# Altium footprint library Toi Library.PcbLib: 740 footprints (part 3 of 47)
Each footprint in its own frame and in the unit in brackets; x right, y up, seen from the top. Pads: shape width x height; smd on the part's side, far side on the other; paste and mask are expansions set on the pad; w line width, h text height; cw(c..) or ccw(c..) is an arc to the next point about the centre after c.
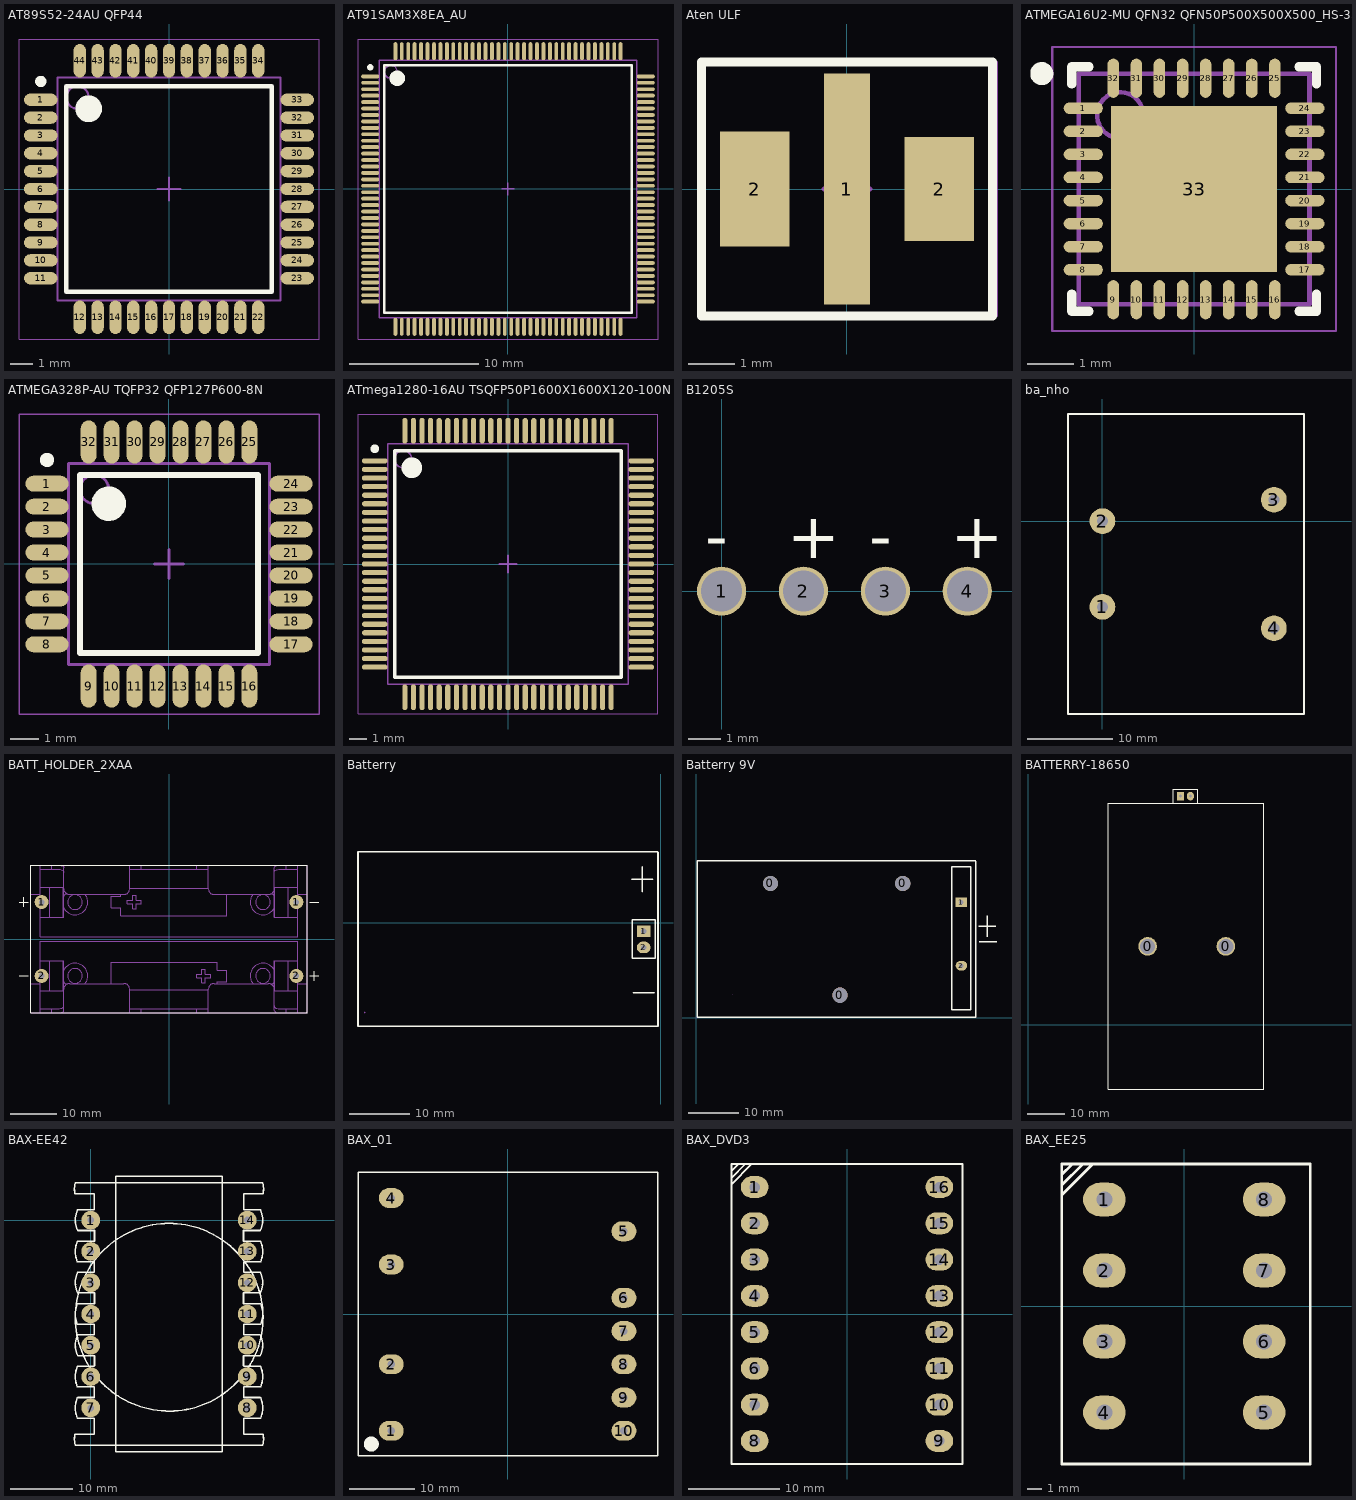
[diagram p2: the footprints below, top view; thin cyan lines are the x and y axes]

## AT89S52-24AU QFP44 [mm] "TQFP, 44-Leads, Body 10.00x10.00mm, Pitch 0.80mm, IPC Medium Density"
height 1.5
pads (44):
  oval 1.5x0.55 smd: 1(-5.75,4) 2(-5.75,3.2) 3(-5.75,2.4) 4(-5.75,1.6) 5(-5.75,0.8) 6(-5.75,0) 7(-5.75,-0.8) 8(-5.75,-1.6) 9(-5.75,-2.4) 10(-5.75,-3.2) 11(-5.75,-4) 23(5.75,-4) 24(5.75,-3.2) 25(5.75,-2.4) 26(5.75,-1.6) 27(5.75,-0.8) 28(5.75,0) 29(5.75,0.8) 30(5.75,1.6) 31(5.75,2.4) 32(5.75,3.2) 33(5.75,4)
  oval 0.55x1.5 smd: 12(-4,-5.75) 13(-3.2,-5.75) 14(-2.4,-5.75) 15(-1.6,-5.75) 16(-0.8,-5.75) 17(0,-5.75) 18(0.8,-5.75) 19(1.6,-5.75) 20(2.4,-5.75) 21(3.2,-5.75) 22(4,-5.75) 34(4,5.75) 35(3.2,5.75) 36(2.4,5.75) 37(1.6,5.75) 38(0.8,5.75) 39(0,5.75) 40(-0.8,5.75) 41(-1.6,5.75) 42(-2.4,5.75) 43(-3.2,5.75) 44(-4,5.75)
Top Overlay:
  circle w0.25: c-5.75,4.825 r0.125
  circle w0.6: c-3.6,3.6 r0.3
  lines w0.2: -4.6,-4.6 -4.6,4.6 4.6,4.6 4.6,-4.6 -4.6,-4.6
Mechanical 13:
  circle w0.1: c-4.1,4.1 r0.5
  lines w0.1: -5,-5 -5,5 5,5 5,-5 -5,-5
Mechanical 15:
  lines w0.05: -6.725,-6.725 -6.725,6.725 6.725,6.725 6.725,-6.725 -6.725,-6.725
  lines w0.1: -0.5,0 0.5,0 ; 0,-0.5 0,0.5
3D body "AT89S52-24AU QFP44.step": height 1.5, standoff 0, extent -6,-6 6,6

## AT91SAM3X8EA_AU [mm] "TSQFP, 144-Leads, Body 20.00x20.00mm, Pitch 0.50mm, IPC Medium Density"
height 1.45
pads (144):
  oval 1.4x0.3 smd: 1(-10.7,8.75) 2(-10.7,8.25) 3(-10.7,7.75) 4(-10.7,7.25) 5(-10.7,6.75) 6(-10.7,6.25) 7(-10.7,5.75) 8(-10.7,5.25) 9(-10.7,4.75) 10(-10.7,4.25) 11(-10.7,3.75) 12(-10.7,3.25) 13(-10.7,2.75) 14(-10.7,2.25) 15(-10.7,1.75) 16(-10.7,1.25) 17(-10.7,0.75) 18(-10.7,0.25) 19(-10.7,-0.25) 20(-10.7,-0.75) 21(-10.7,-1.25) 22(-10.7,-1.75) 23(-10.7,-2.25) 24(-10.7,-2.75) 25(-10.7,-3.25) 26(-10.7,-3.75) 27(-10.7,-4.25) 28(-10.7,-4.75) 29(-10.7,-5.25) 30(-10.7,-5.75) 31(-10.7,-6.25) 32(-10.7,-6.75) 33(-10.7,-7.25) 34(-10.7,-7.75) 35(-10.7,-8.25) 36(-10.7,-8.75) 73(10.7,-8.75) 74(10.7,-8.25) 75(10.7,-7.75) 76(10.7,-7.25) 77(10.7,-6.75) 78(10.7,-6.25) 79(10.7,-5.75) 80(10.7,-5.25) 81(10.7,-4.75) 82(10.7,-4.25) 83(10.7,-3.75) 84(10.7,-3.25) 85(10.7,-2.75) 86(10.7,-2.25) 87(10.7,-1.75) 88(10.7,-1.25) 89(10.7,-0.75) 90(10.7,-0.25) 91(10.7,0.25) 92(10.7,0.75) 93(10.7,1.25) 94(10.7,1.75) 95(10.7,2.25) 96(10.7,2.75) 97(10.7,3.25) 98(10.7,3.75) 99(10.7,4.25) 100(10.7,4.75) 101(10.7,5.25) 102(10.7,5.75) 103(10.7,6.25) 104(10.7,6.75) 105(10.7,7.25) 106(10.7,7.75) 107(10.7,8.25) 108(10.7,8.75)
  oval 0.3x1.4 smd: 37(-8.75,-10.7) 38(-8.25,-10.7) 39(-7.75,-10.7) 40(-7.25,-10.7) 41(-6.75,-10.7) 42(-6.25,-10.7) 43(-5.75,-10.7) 44(-5.25,-10.7) 45(-4.75,-10.7) 46(-4.25,-10.7) 47(-3.75,-10.7) 48(-3.25,-10.7) 49(-2.75,-10.7) 50(-2.25,-10.7) 51(-1.75,-10.7) 52(-1.25,-10.7) 53(-0.75,-10.7) 54(-0.25,-10.7) 55(0.25,-10.7) 56(0.75,-10.7) 57(1.25,-10.7) 58(1.75,-10.7) 59(2.25,-10.7) 60(2.75,-10.7) 61(3.25,-10.7) 62(3.75,-10.7) 63(4.25,-10.7) 64(4.75,-10.7) 65(5.25,-10.7) 66(5.75,-10.7) 67(6.25,-10.7) 68(6.75,-10.7) 69(7.25,-10.7) 70(7.75,-10.7) 71(8.25,-10.7) 72(8.75,-10.7) 109(8.75,10.7) 110(8.25,10.7) 111(7.75,10.7) 112(7.25,10.7) 113(6.75,10.7) 114(6.25,10.7) 115(5.75,10.7) 116(5.25,10.7) 117(4.75,10.7) 118(4.25,10.7) 119(3.75,10.7) 120(3.25,10.7) 121(2.75,10.7) 122(2.25,10.7) 123(1.75,10.7) 124(1.25,10.7) 125(0.75,10.7) 126(0.25,10.7) 127(-0.25,10.7) 128(-0.75,10.7) 129(-1.25,10.7) 130(-1.75,10.7) 131(-2.25,10.7) 132(-2.75,10.7) 133(-3.25,10.7) 134(-3.75,10.7) 135(-4.25,10.7) 136(-4.75,10.7) 137(-5.25,10.7) 138(-5.75,10.7) 139(-6.25,10.7) 140(-6.75,10.7) 141(-7.25,10.7) 142(-7.75,10.7) 143(-8.25,10.7) 144(-8.75,10.7)
Top Overlay:
  circle w0.6: c-8.6,8.6 r0.3
  circle w0.25: c-10.7,9.45 r0.125
  lines w0.2: -9.6,-9.6 9.6,-9.6 9.6,9.6 -9.6,9.6 -9.6,-9.6
Mechanical 13:
  circle w0.1: c-9.1,9.1 r0.5
  lines w0.1: -10,-10 10,-10 10,10 -10,10 -10,-10
Mechanical 15:
  lines w0.05: -11.65,-11.65 11.65,-11.65 11.65,11.65 -11.65,11.65 -11.65,-11.65
  lines w0.1: -0.5,0 0.5,0 ; 0,-0.5 0,0.5
3D body "AT91SAM3X8EA_AU.step": height 1.45, standoff 0, extent -10.9,-10.9 10.9,10.9

## Aten ULF [mm] "Molded Capacitor, 2-Leads, Body 6.00x3.20mm, IPC Medium Density"
height 2.5
pads (3):
  rect 1x5 smd: 1(0,0)
  rect 1.5x2.5 smd: 2(-2,0)
  rect 1.5x2.25 smd: 2(2,0)
Top Overlay:
  lines w0.2: -3.15,-2.75 -3.15,2.75 3.15,2.75 3.15,-2.75 -3.15,-2.75
Mechanical 13:
  lines w0.1: -3.15,-2.75 3.15,-2.75 3.15,2.75 -3.15,2.75 -3.15,-2.75
Mechanical 15:
  lines w0.05: -3.125,-2.75 3.25,-2.75 3.25,2.75 -3.125,2.75 -3.125,-2.75
  lines w0.1: -0.5,0 0.5,0 ; 0,-0.5 0,0.5
3D body "SW3dPS-UFL-R-SMD.STEP": height 1.25, standoff 0, extent -1.7,-1.55 1.7,1.55

## ATMEGA16U2-MU QFN32 QFN50P500X500X500_HS-33N [mm] "QFN, 32-Leads, Body 5.00x5.00mm, Pitch 0.50mm, Thermal Pad 3.60x3.60mm, IPC Medium Density"
height 1
pads (33):
  oval 0.85x0.25 smd: 1(-2.4,1.75) 2(-2.4,1.25) 3(-2.4,0.75) 4(-2.4,0.25) 5(-2.4,-0.25) 6(-2.4,-0.75) 7(-2.4,-1.25) 8(-2.4,-1.75) 17(2.4,-1.75) 18(2.4,-1.25) 19(2.4,-0.75) 20(2.4,-0.25) 21(2.4,0.25) 22(2.4,0.75) 23(2.4,1.25) 24(2.4,1.75)
  oval 0.25x0.85 smd: 9(-1.75,-2.4) 10(-1.25,-2.4) 11(-0.75,-2.4) 12(-0.25,-2.4) 13(0.25,-2.4) 14(0.75,-2.4) 15(1.25,-2.4) 16(1.75,-2.4) 25(1.75,2.4) 26(1.25,2.4) 27(0.75,2.4) 28(0.25,2.4) 29(-0.25,2.4) 30(-0.75,2.4) 31(-1.25,2.4) 32(-1.75,2.4)
  rect 3.6x3.6 smd: 33(0,0)
Top Overlay:
  circle w0.25: c-3.3,2.5 r0.125
  lines w0.2: -2.65,-2.275 -2.65,-2.65 -2.275,-2.65 ; -2.65,2.275 -2.65,2.65 -2.275,2.65 ; 2.275,-2.65 2.65,-2.65 2.65,-2.275 ; 2.275,2.65 2.65,2.65 2.65,2.275
Mechanical 13:
  circle w0.1: c-1.6,1.6 r0.5
  lines w0.1: -2.5,-2.5 2.5,-2.5 2.5,2.5 -2.5,2.5 -2.5,-2.5
Mechanical 15:
  lines w0.05: -3.075,-3.075 3.075,-3.075 3.075,3.075 -3.075,3.075 -3.075,-3.075
  lines w0.1: -0.5,0 0.5,0 ; 0,-0.5 0,0.5
3D body "ATMEGA16U2-MU QFN32 QFN50P500X500X500_HS-33N.step": height 1, standoff 0, extent -2.55,-2.55 2.55,2.55

## ATMEGA328P-AU TQFP32 QFP127P600-8N [mm]
height 1.2
pads (32):
  oval 1.5x0.55 smd: 1(-4.25,2.8) 2(-4.25,2) 3(-4.25,1.2) 4(-4.25,0.4) 5(-4.25,-0.4) 6(-4.25,-1.2) 7(-4.25,-2) 8(-4.25,-2.8) 17(4.25,-2.8) 18(4.25,-2) 19(4.25,-1.2) 20(4.25,-0.4) 21(4.25,0.4) 22(4.25,1.2) 23(4.25,2) 24(4.25,2.8)
  oval 0.55x1.5 smd: 9(-2.8,-4.25) 10(-2,-4.25) 11(-1.2,-4.25) 12(-0.4,-4.25) 13(0.4,-4.25) 14(1.2,-4.25) 15(2,-4.25) 16(2.8,-4.25) 25(2.8,4.25) 26(2,4.25) 27(1.2,4.25) 28(0.4,4.25) 29(-0.4,4.25) 30(-1.2,4.25) 31(-2,4.25) 32(-2.8,4.25)
Top Overlay:
  circle w0.6: c-2.1,2.1 r0.3
  circle w0.25: c-4.25,3.625 r0.125
  lines w0.2: -3.1,-3.1 3.1,-3.1 3.1,3.1 -3.1,3.1 -3.1,-3.1
Mechanical 13:
  circle w0.1: c-2.6,2.6 r0.5
  lines w0.1: -3.5,-3.5 3.5,-3.5 3.5,3.5 -3.5,3.5 -3.5,-3.5
Mechanical 15:
  lines w0.05: -5.225,-5.225 5.225,-5.225 5.225,5.225 -5.225,5.225 -5.225,-5.225
  lines w0.1: -0.5,0 0.5,0 ; 0,-0.5 0,0.5
3D body "ATMEGA328P-AU TQFP32 QFP127P600-8N.step": height 1.2, standoff 0, extent -4.5,-4.5 4.5,4.5

## ATmega1280-16AU TSQFP50P1600X1600X120-100N [mm] "TSQFP, 100-Leads, Body 14.00x14.00mm, Pitch 0.50mm, IPC Medium Density"
height 1.2
pads (100):
  oval 1.5x0.3 smd: 1(-7.75,6) 2(-7.75,5.5) 3(-7.75,5) 4(-7.75,4.5) 5(-7.75,4) 6(-7.75,3.5) 7(-7.75,3) 8(-7.75,2.5) 9(-7.75,2) 10(-7.75,1.5) 11(-7.75,1) 12(-7.75,0.5) 13(-7.75,0) 14(-7.75,-0.5) 15(-7.75,-1) 16(-7.75,-1.5) 17(-7.75,-2) 18(-7.75,-2.5) 19(-7.75,-3) 20(-7.75,-3.5) 21(-7.75,-4) 22(-7.75,-4.5) 23(-7.75,-5) 24(-7.75,-5.5) 25(-7.75,-6) 51(7.75,-6) 52(7.75,-5.5) 53(7.75,-5) 54(7.75,-4.5) 55(7.75,-4) 56(7.75,-3.5) 57(7.75,-3) 58(7.75,-2.5) 59(7.75,-2) 60(7.75,-1.5) 61(7.75,-1) 62(7.75,-0.5) 63(7.75,0) 64(7.75,0.5) 65(7.75,1) 66(7.75,1.5) 67(7.75,2) 68(7.75,2.5) 69(7.75,3) 70(7.75,3.5) 71(7.75,4) 72(7.75,4.5) 73(7.75,5) 74(7.75,5.5) 75(7.75,6)
  oval 0.3x1.5 smd: 26(-6,-7.75) 27(-5.5,-7.75) 28(-5,-7.75) 29(-4.5,-7.75) 30(-4,-7.75) 31(-3.5,-7.75) 32(-3,-7.75) 33(-2.5,-7.75) 34(-2,-7.75) 35(-1.5,-7.75) 36(-1,-7.75) 37(-0.5,-7.75) 38(0,-7.75) 39(0.5,-7.75) 40(1,-7.75) 41(1.5,-7.75) 42(2,-7.75) 43(2.5,-7.75) 44(3,-7.75) 45(3.5,-7.75) 46(4,-7.75) 47(4.5,-7.75) 48(5,-7.75) 49(5.5,-7.75) 50(6,-7.75) 76(6,7.75) 77(5.5,7.75) 78(5,7.75) 79(4.5,7.75) 80(4,7.75) 81(3.5,7.75) 82(3,7.75) 83(2.5,7.75) 84(2,7.75) 85(1.5,7.75) 86(1,7.75) 87(0.5,7.75) 88(0,7.75) 89(-0.5,7.75) 90(-1,7.75) 91(-1.5,7.75) 92(-2,7.75) 93(-2.5,7.75) 94(-3,7.75) 95(-3.5,7.75) 96(-4,7.75) 97(-4.5,7.75) 98(-5,7.75) 99(-5.5,7.75) 100(-6,7.75)
Top Overlay:
  circle w0.6: c-5.6,5.6 r0.3
  circle w0.25: c-7.75,6.7 r0.125
  lines w0.2: -6.6,-6.6 6.6,-6.6 6.6,6.6 -6.6,6.6 -6.6,-6.6
Mechanical 13:
  circle w0.1: c-6.1,6.1 r0.5
  lines w0.1: -7,-7 7,-7 7,7 -7,7 -7,-7
Mechanical 15:
  lines w0.05: -8.725,-8.725 8.725,-8.725 8.725,8.725 -8.725,8.725 -8.725,-8.725
  lines w0.1: -0.5,0 0.5,0 ; 0,-0.5 0,0.5
3D body "ATmega1280-16AU TSQFP50P1600X1600X120-100N.step": height 1.2, standoff 0, extent -8,-8 8,8

## B1205S [mil] "B1205S-1W Chuy?n Ð?i DC-DC Vào 12V Ra 5V 1W"
pads (4):
  round 60 hole 50: 1(0,0) 2(100,0) 3(200,0) 4(300,0)
Top Overlay:
  text "-" at -20,40 h56.25
  text "+" at 80,40 h56.25
  text "+" at 280,40 h56.25
  text "-" at 180,40 h56.25

## ba_nho [mm]
pads (4):
  round 3 hole 1.27: 1(0,-10) 2(0,0) 3(20,2.5) 4(20,-12.5)
Top Overlay:
  lines w0.254: -4,-22.5 -4,12.5 23.5,12.5 23.5,-22.5 -4,-22.5

## BATT_HOLDER_2XAA [mil] "2-cell AA battery holder"
height 660
pads (4):
  round 120 hole 48: 1(-1086.61,314.96) 1(1086.61,314.96) 2(-1086.61,-314.96) 2(1086.61,-314.96)
Top Overlay:
  lines w5: -1279.53,-314.96 -1200.79,-314.96 ; -1279.53,314.96 -1200.79,314.96 ; -1240.16,275.59 -1240.16,354.33 ; 1200.79,-314.96 1279.53,-314.96 ; 1200.79,314.96 1279.53,314.96 ; 1240.16,-354.33 1240.16,-275.59
  lines w7.87: -1181.1,-629.92 1181.1,-629.92 1181.1,629.92 -1181.1,629.92 -1181.1,-629.92
Mechanical 13:
  drawing of 198 lines, arcs and shapes, not listed
3D body "2xAA Battery Holder.STEP": height 657.48, standoff -118.11, extent -1181.1,-629.91 1181.1,629.93
3D body "User Library-Battery-AAA.STEP": height 595.47, standoff 191.93, extent -958.03,55 788.03,458.55
3D body "User Library-Battery-AAA.STEP": height 595.47, standoff 191.93, extent -918.03,-470 828.03,-66.45

## Batterry [mil]
pads (2):
  rect 90x75 hole 34: 1(-112.5,-54.6)
  oval 90x75 hole 34: 2(-112.5,-159.6)
Top Overlay:
  lines w10: -188.8,284 -54.5,284 ; -182.1,-455.9 -43.1,-455.9 ; -120.9,202.1 -120.9,365.8 ; -20,463.4 -1974.6,463.4 -1974.6,-672.4 -19.27,-672.4 -19.27,459.86 ; -187.5,-229.6 -37.5,-229.6 -37.5,20.4 -187.5,20.4 -187.5,-229.6
Mechanical 1:
  lines w10: -1929.25,-583.45 -1929.2,-583.41
3D body "User Library-Aluminum 9 Volt Battery Holder.STEP": height 718.5, standoff 0, extent -1960.3,-666.19 -27.8,458.8

## Batterry 9V [mil]
pads (5):
  round 120 hole 120: 0(581.4,1052.4) 0(1126.9,175.9) 0(1620.4,1052.5)
  rect 90x75 hole 34: 1(2080.5,905.75)
  oval 90x75 hole 34: 2(2080.5,407.05)
Top Overlay:
  lines w10: 2193,1230.1 4.6,1230.1 4.6,3.1 2193.73,3.1 2193.73,1226.56 ; 2216.7,717.5 2351,717.5 ; 2221,595 2360,595 ; 2284.6,635.6 2284.6,799.3 ; 2005.5,60 2005.5,1185 2155.5,1185 2155.5,60 2005.5,60
Mechanical 1:
  lines w10: 283.75,183.25 283.8,183.29
3D body "User Library-9V Duracell Battery-1.STEP": height 894.49, standoff 205.51, extent 140.78,88.65 2050.23,1131.96
3D body "User Library-PP3 9V battery holder.STEP": height 855.91, standoff 44.88, extent 27.27,19.55 2172.93,1210.5

## BATTERRY-18650 [mil]
pads (4):
  round 196.85 hole 157.48: 0(1260,825) 0(2085,825)
  rect 75x90 hole 34: 1(1606.1,2410.5)
  oval 75x90 hole 34: 2(1711.1,2410.5)
Top Overlay:
  lines w10: 845,-680 2485,-680 2485,2335 845,2335 845,-680 ; 1531.1,2335.5 1781.1,2335.5 1781.1,2485.5 1531.1,2485.5 1531.1,2335.5
3D body "User Library-18650 battery - Copy.STEP": height 959.53, standoff 242.99, extent 1698.47,-492.48 2415,2072.48
3D body "User Library-18650 holder x2.STEP": height 826.77, standoff 0, extent 860.82,-671.06 2475,2321.06
3D body "User Library-18650 battery.STEP": height 959.53, standoff 242.99, extent 905,-497.48 1621.53,2067.48

## BAX-EE42 [mm]
pads (14):
  round 3 hole 1.1: 1(0,0) 2(0,-5) 3(0,-10) 4(0,-15) 5(0,-20) 6(0,-25) 7(0,-30) 8(25,-30) 9(25,-25) 10(25,-20) 11(25,-15) 12(25,-10) 13(25,-5) 14(25,0)
Top Overlay:
  lines w0.254: -2.54,-34.199 ccw(c1.383,-34.971) -2.495,-35.943 ; -2.54,4.201 cw(c1.383,4.974) -2.495,5.945 ; -2.515,-34.188 0.559,-34.188 0.559,-31.648 -2.083,-31.648 ; -2.515,4.191 0.559,4.191 0.559,1.651 -2.083,1.651 ; -2.5,-36 27.5,-36 ; -2.5,6 27.5,6 ; -2.464,-14.986 ccw(c12.522,-15.519) -2.458,-14.838 ; -2.147,-28.374 ccw(c1.506,-30.001) -2.136,-31.652 ; -2.147,-23.371 ccw(c1.506,-24.997) -2.136,-26.648 ; -2.147,-13.363 ccw(c1.506,-14.989) -2.136,-16.64 ; -2.147,-3.381 ccw(c1.506,-5.007) -2.136,-6.658 ; -2.121,-18.367 ccw(c1.531,-19.993) -2.11,-21.644 ; -2.121,-8.359 ccw(c1.531,-9.985) -2.11,-11.636 ; -2.121,1.623 ccw(c1.531,-0.003) -2.11,-1.654 ; -2.108,-28.346 0.533,-28.346 ; -2.108,-23.343 0.533,-23.343 ; -2.108,-13.335 0.533,-13.335 ; -2.108,-3.353 0.533,-3.353 ; -2.083,-26.645 0.559,-26.645 ; -2.083,-18.339 0.559,-18.339 ; -2.083,-16.637 0.559,-16.637 0.559,-18.288 ; -2.083,-8.331 0.559,-8.331 ; -2.083,-6.655 0.559,-6.655 0.559,-8.306 ; -2.057,-21.641 0.584,-21.641 0.584,-23.292 ; -2.057,-11.633 0.584,-11.633 ; -2.057,-1.651 0.584,-1.651 ; 0.559,-28.321 0.559,-26.67 ; 0.584,-13.335 0.584,-11.684 ; 0.584,-3.353 0.584,-1.702 ; 4.013,-37.008 4.013,7.01 20.98,7.01 20.98,-37.008 4.039,-37.008 ; 24.409,-23.292 24.409,-21.641 27.051,-21.641 ; 24.409,-13.335 24.409,-11.684 ; 24.409,-11.633 27.051,-11.633 ; 24.409,-3.353 24.409,-1.702 ; 24.409,-1.651 27.051,-1.651 ; 24.435,-28.321 24.435,-26.67 ; 24.435,-26.645 27.076,-26.645 ; 24.435,-18.339 27.076,-18.339 ; 24.435,-18.288 24.435,-16.637 27.076,-16.637 ; 24.435,-8.331 27.076,-8.331 ; 24.435,-8.306 24.435,-6.655 27.076,-6.655 ; 24.46,-28.346 27.102,-28.346 ; 24.46,-23.343 27.102,-23.343 ; 24.46,-13.335 27.102,-13.335 ; 24.46,-3.353 27.102,-3.353 ; 27.076,-31.648 24.435,-31.648 24.435,-34.188 27.508,-34.188 ; 27.076,1.651 24.435,1.651 24.435,4.191 27.508,4.191 ; 27.104,-21.644 ccw(c23.462,-19.993) 27.115,-18.367 ; 27.104,-11.636 ccw(c23.462,-9.985) 27.115,-8.359 ; 27.104,-1.654 ccw(c23.462,-0.003) 27.115,1.623 ; 27.129,-31.652 ccw(c23.488,-30.001) 27.14,-28.374 ; 27.129,-26.648 ccw(c23.488,-24.997) 27.14,-23.371 ; 27.129,-16.64 ccw(c23.488,-14.989) 27.14,-13.363 ; 27.129,-6.658 ccw(c23.488,-5.007) 27.14,-3.381 ; 27.489,-35.943 ccw(c23.61,-34.971) 27.533,-34.199 ; 27.489,5.945 cw(c23.61,4.974) 27.533,4.201

## BAX_01 [mil] "Bien ap xung cho nguon T9AT"
pads (10):
  oval 150x120 hole 45: 1(-700,-700) 2(-700,-300) 3(-700,300) 4(-700,700) 5(700,500) 6(700,100) 7(700,-100) 8(700,-300) 9(700,-500) 10(700,-700)
Top Overlay:
  circle w50: c-820,-780 r20
  lines w8: -900,-850 -900,855 905,855 905,-850 -900,-850

## BAX_DVD3 [mil] "Bien ap xung DVD3"
pads (16):
  oval 120x95 hole 45: 1(-400,550) 2(-400,392.86) 3(-400,235.71) 4(-400,78.57) 5(-400,-78.57) 6(-400,-235.71) 7(-400,-392.86) 8(-400,-550) 9(400,-550) 10(400,-392.86) 11(400,-235.71) 12(400,-78.57) 13(400,78.57) 14(400,235.71) 15(400,392.86) 16(400,550)
Top Overlay:
  lines w8: -500,563 -414,649 ; -500,589 -500,591 -442,649 ; -500,618 -500,620 -471,649 ; -500,-650 500,-650 500,650 490,650 -500,650 -500,-650

## BAX_EE25 [mil] "EE25"
pads (8):
  oval 120x95 hole 45: 1(-225,300) 2(-225,100) 3(-225,-100) 4(-225,-300) 5(225,-300) 6(225,-100) 7(225,100) 8(225,300)
Top Overlay:
  lines w8: -345,313 -259,399 ; -345,339 -345,341 -287,399 ; -345,368 -345,370 -316,399 ; -345,-445 355,-445 355,400 -345,400 -345,-445